# Altium footprint library CADTlink.PcbLib: 143 footprints (part 6 of 9)
Each footprint in its own frame and in the unit in brackets; x right, y up, seen from the top. Pads: shape width x height; smd on the part's side, far side on the other; paste and mask are expansions set on the pad; w line width, h text height; cw(c..) or ccw(c..) is an arc to the next point about the centre after c.
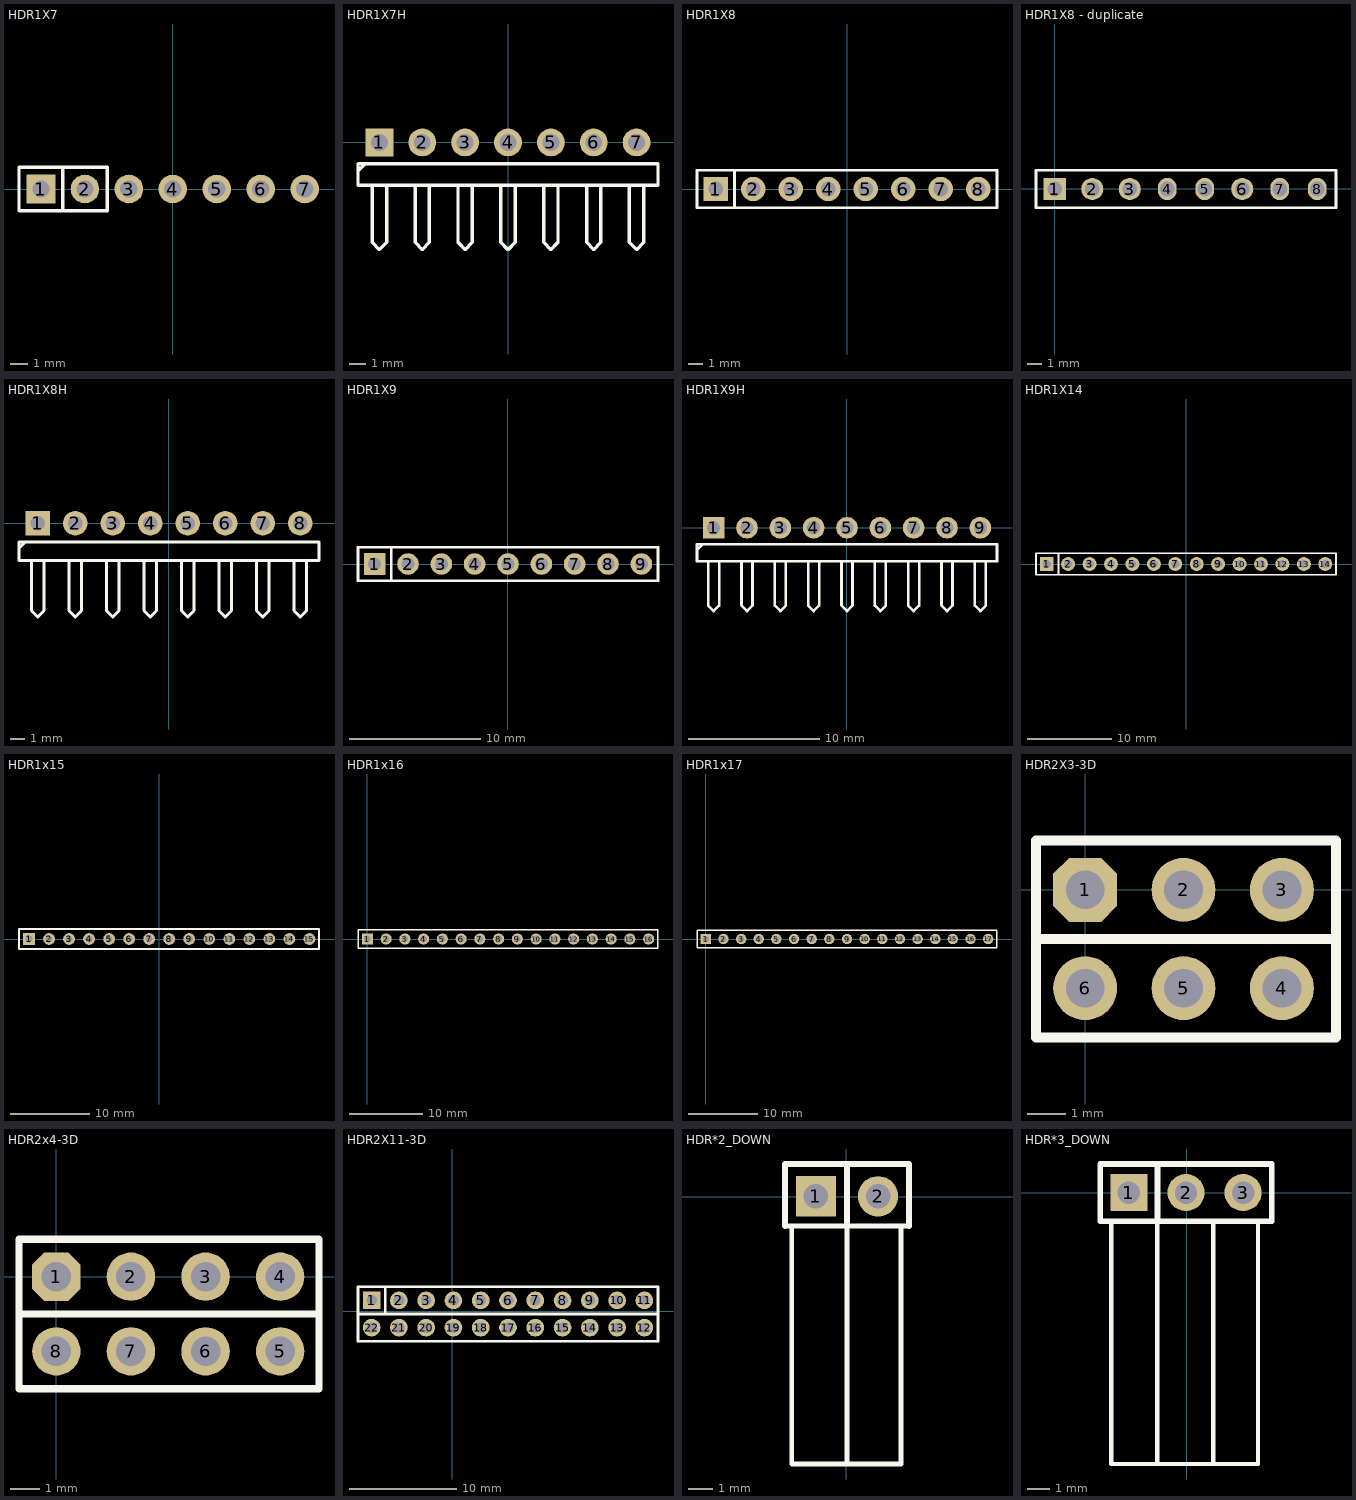
[diagram p5: the footprints below, top view; thin cyan lines are the x and y axes]

## HDR1X7 [mm]
pads (7):
  rect 1.65x1.65 hole 1: 1(-7.605,0)
  round 1.65 hole 1: 2(-5.065,0) 3(-2.525,0) 4(0.015,0) 5(2.555,0) 6(5.095,0) 7(7.635,0)
Top Overlay:
  lines w0.2: -6.335,-1.27 -6.335,1.27 ; -8.875,-1.27 -8.875,1.27 -3.785,1.27 -3.785,-1.27 -8.875,-1.27

## HDR1X7H [mm]
pads (7):
  rect 1.65x1.65 hole 1: 1(-7.62,0)
  round 1.65 hole 1: 2(-5.08,0) 3(-2.54,0) 4(0,0) 5(2.54,0) 6(5.08,0) 7(7.62,0)
Top Overlay:
  lines w0.2: -8.89,-1.693 -8.467,-1.27 ; -8.043,-2.54 -8.043,-5.927 -7.62,-6.35 -7.197,-5.927 -7.197,-2.54 ; -5.503,-2.54 -5.503,-5.927 -5.08,-6.35 -4.657,-5.927 -4.657,-2.54 ; -2.963,-2.54 -2.963,-5.927 -2.54,-6.35 -2.117,-5.927 -2.117,-2.54 ; -0.423,-2.54 -0.423,-5.927 0,-6.35 0.423,-5.927 0.423,-2.54 ; 2.117,-2.54 2.117,-5.927 2.54,-6.35 2.963,-5.927 2.963,-2.54 ; 4.657,-2.54 4.657,-5.927 5.08,-6.35 5.503,-5.927 5.503,-2.54 ; 7.197,-2.54 7.197,-5.927 7.62,-6.35 8.043,-5.927 8.043,-2.54 ; -8.89,-2.54 8.89,-2.54 8.89,-1.27 -8.89,-1.27 -8.89,-2.54

## HDR1X8 [mm]
pads (8):
  rect 1.65x1.65 hole 1: 1(-8.905,0)
  round 1.65 hole 1: 2(-6.365,0) 3(-3.825,0) 4(-1.285,0) 5(1.255,0) 6(3.795,0) 7(6.335,0) 8(8.875,0)
Top Overlay:
  lines w0.2: -7.635,-1.27 -7.635,1.27 ; -10.175,-1.27 10.145,-1.27 10.145,1.27 -10.175,1.27 -10.175,-1.27
3D body: height 0.7, standoff -10.9, extent -10.185,-1.321 10.135,1.219

## HDR1X8 - duplicate [mm] "Connector; Header; 8 Position"
pads (8):
  rect 1.5x1.5 hole 1: 1(0,0)
  round 1.5 hole 1: 2(2.54,0) 3(5.08,0) 6(12.7,0)
  oval 1.27x1.5 hole 1: 4(7.62,0) 5(10.16,0) 7(15.24,0) 8(17.78,0)
Top Overlay:
  lines w0.2: -1.27,-1.27 -1.27,1.27 19.05,1.27 19.05,-1.27 -1.27,-1.27
3D body: height 0.7, standoff -10.9, extent -1.27,-1.27 19.05,1.27

## HDR1X8H [mm]
pads (8):
  rect 1.65x1.65 hole 1: 1(-8.875,0)
  round 1.65 hole 1: 2(-6.335,0) 3(-3.795,0) 4(-1.255,0) 5(1.285,0) 6(3.825,0) 7(6.365,0) 8(8.905,0)
Top Overlay:
  lines w0.2: -10.145,-1.693 -9.722,-1.27 ; -9.298,-2.54 -9.298,-5.927 -8.875,-6.35 -8.452,-5.927 -8.452,-2.54 ; -6.758,-2.54 -6.758,-5.927 -6.335,-6.35 -5.912,-5.927 -5.912,-2.54 ; -4.218,-2.54 -4.218,-5.927 -3.795,-6.35 -3.372,-5.927 -3.372,-2.54 ; -1.678,-2.54 -1.678,-5.927 -1.255,-6.35 -0.832,-5.927 -0.832,-2.54 ; 0.862,-2.54 0.862,-5.927 1.285,-6.35 1.708,-5.927 1.708,-2.54 ; 3.402,-2.54 3.402,-5.927 3.825,-6.35 4.248,-5.927 4.248,-2.54 ; 5.942,-2.54 5.942,-5.927 6.365,-6.35 6.788,-5.927 6.788,-2.54 ; 8.482,-2.54 8.482,-5.927 8.905,-6.35 9.328,-5.927 9.328,-2.54 ; -10.145,-2.54 10.175,-2.54 10.175,-1.27 -10.145,-1.27 -10.145,-2.54

## HDR1X9 [mm]
pads (9):
  rect 1.65x1.65 hole 1: 1(-10.13,0)
  round 1.65 hole 1: 2(-7.59,0) 3(-5.05,0) 4(-2.51,0) 5(0.03,0) 6(2.57,0) 7(5.11,0) 8(7.65,0) 9(10.19,0)
Top Overlay:
  lines w0.2: -8.86,-1.27 -8.86,1.27 ; -11.4,-1.27 11.46,-1.27 11.46,1.27 -11.4,1.27 -11.4,-1.27

## HDR1X9H [mm]
pads (9):
  rect 1.65x1.65 hole 1: 1(-10.13,0)
  round 1.65 hole 1: 2(-7.59,0) 3(-5.05,0) 4(-2.51,0) 5(0.03,0) 6(2.57,0) 7(5.11,0) 8(7.65,0) 9(10.19,0)
Top Overlay:
  lines w0.2: -11.4,-1.693 -10.977,-1.27 ; -10.553,-2.54 -10.553,-5.927 -10.13,-6.35 -9.707,-5.927 -9.707,-2.54 ; -8.013,-2.54 -8.013,-5.927 -7.59,-6.35 -7.167,-5.927 -7.167,-2.54 ; -5.473,-2.54 -5.473,-5.927 -5.05,-6.35 -4.627,-5.927 -4.627,-2.54 ; -2.933,-2.54 -2.933,-5.927 -2.51,-6.35 -2.087,-5.927 -2.087,-2.54 ; -0.393,-2.54 -0.393,-5.927 0.03,-6.35 0.453,-5.927 0.453,-2.54 ; 2.147,-2.54 2.147,-5.927 2.57,-6.35 2.993,-5.927 2.993,-2.54 ; 4.687,-2.54 4.687,-5.927 5.11,-6.35 5.533,-5.927 5.533,-2.54 ; 7.227,-2.54 7.227,-5.927 7.65,-6.35 8.073,-5.927 8.073,-2.54 ; 9.767,-2.54 9.767,-5.927 10.19,-6.35 10.613,-5.927 10.613,-2.54 ; -11.4,-2.54 11.46,-2.54 11.46,-1.27 -11.4,-1.27 -11.4,-2.54

## HDR1X14 [mm]
pads (14):
  rect 1.65x1.65 hole 1: 1(-16.51,0)
  round 1.65 hole 1: 2(-13.97,0) 3(-11.43,0) 4(-8.89,0) 5(-6.35,0) 6(-3.81,0) 7(-1.27,0) 8(1.27,0) 9(3.81,0) 10(6.35,0) 11(8.89,0) 12(11.43,0) 13(13.97,0) 14(16.51,0)
Top Overlay:
  lines w0.2: -15.113,-1.27 -15.113,1.27 ; -17.78,-1.27 -17.78,1.27 17.78,1.27 17.78,-1.27 -17.78,-1.27

## HDR1x15 [mm]
pads (15):
  rect 1.5x1.5 hole 0.9: 1(-16.51,0)
  round 1.5 hole 0.9: 2(-13.97,0) 3(-11.43,0) 4(-8.89,0) 5(-6.35,0) 6(-3.81,0) 7(-1.27,0) 8(1.27,0) 9(3.81,0) 10(6.35,0) 11(8.89,0) 12(11.43,0) 13(13.97,0) 14(16.51,0) 15(19.05,0)
Top Overlay:
  lines w0.2: -17.78,-1.27 20.269,-1.27 20.269,1.27 -15.875,1.27 -17.78,1.27 -17.78,-1.27

## HDR1x16 [mm]
pads (16):
  rect 1.5x1.5 hole 0.9: 1(0,0)
  round 1.5 hole 0.9: 2(2.54,0) 3(5.08,0) 4(7.62,0) 5(10.16,0) 6(12.7,0) 7(15.24,0) 8(17.78,0) 9(20.32,0) 10(22.86,0) 11(25.4,0) 12(27.94,0) 13(30.48,0) 14(33.02,0) 15(35.56,0) 16(38.1,0)
Top Overlay:
  lines w0.2: -1.27,-1.27 -1.27,1.27 0.635,1.27 39.37,1.27 39.37,-1.27 -1.27,-1.27

## HDR1x17 [mm]
pads (17):
  rect 1.5x1.5 hole 0.9: 1(0,0)
  round 1.5 hole 0.9: 2(2.54,0) 3(5.08,0) 4(7.62,0) 5(10.16,0) 6(12.7,0) 7(15.24,0) 8(17.78,0) 9(20.32,0) 10(22.86,0) 11(25.4,0) 12(27.94,0) 13(30.48,0) 14(33.02,0) 15(35.56,0) 16(38.1,0) 17(40.64,0)
Top Overlay:
  lines w0.2: -1.27,-1.27 41.91,-1.27 41.91,1.27 0.635,1.27 -1.27,1.27 -1.27,-1.27
3D body: height 8.67, standoff -2.87, extent -1.137,-1.346 41.828,1.194

## HDR2X3-3D [mm]
pads (6):
  oct 1.65x1.65 hole 1: 1(0,0)
  round 1.65 hole 1: 2(2.54,0) 3(5.08,0) 4(5.08,-2.54) 5(2.54,-2.54) 6(0,-2.54)
Top Overlay:
  lines w0.254: -1.27,-1.27 6.477,-1.27 ; -1.27,-1.27 -1.27,1.27 6.477,1.27 6.477,-1.27 ; -1.27,-1.27 -1.27,-3.81 6.477,-3.81 6.477,-1.27 ; -1.27,-1.27 6.477,-1.27
3D body: height 8.54, standoff -3, extent -1.27,-1.27 1.27,1.27
3D body: height 8.54, standoff -3, extent 1.27,-1.27 3.81,1.27
3D body: height 8.54, standoff -3, extent 3.81,-1.27 6.35,1.27
3D body: height 8.54, standoff -3, extent 3.81,-3.81 6.35,-1.27
3D body: height 8.54, standoff -3, extent 1.27,-3.81 3.81,-1.27
3D body: height 8.54, standoff -3, extent -1.27,-3.81 1.27,-1.27

## HDR2x4-3D [mm]
pads (8):
  oct 1.65x1.65 hole 1: 1(0,0)
  round 1.65 hole 1: 2(2.54,0) 3(5.08,0) 4(7.62,0) 5(7.62,-2.54) 6(5.08,-2.54) 7(2.54,-2.54) 8(0,-2.54)
Top Overlay:
  lines w0.254: -1.27,-1.27 8.941,-1.27 ; -1.27,-1.27 -1.27,-3.81 8.941,-3.81 8.941,-1.27 ; -1.27,-1.27 -1.27,1.27 8.941,1.27 8.941,-1.27 ; -1.27,-1.27 8.941,-1.27
3D body: height 8.54, standoff -3, extent 6.35,-1.397 8.89,1.143
3D body: height 8.54, standoff -3, extent 6.35,-3.937 8.89,-1.397
3D body: height 8.54, standoff -3, extent -1.27,-3.81 1.27,-1.27
3D body: height 8.54, standoff -3, extent 1.27,-3.81 3.81,-1.27
3D body: height 8.54, standoff -3, extent 3.81,-3.81 6.35,-1.27
3D body: height 8.54, standoff -3, extent 3.81,-1.27 6.35,1.27
3D body: height 8.54, standoff -3, extent 1.27,-1.27 3.81,1.27
3D body: height 8.54, standoff -3, extent -1.27,-1.27 1.27,1.27

## HDR2X11-3D [mm]
pads (22):
  rect 1.65x1.65 hole 1: 1(-7.493,1.016)
  round 1.65 hole 1: 2(-4.953,1.016) 3(-2.413,1.016) 4(0.127,1.016) 5(2.667,1.016) 6(5.207,1.016) 7(7.747,1.016) 8(10.287,1.016) 9(12.827,1.016) 10(15.367,1.016) 11(17.907,1.016) 12(17.907,-1.524) 13(15.367,-1.524) 14(12.827,-1.524) 15(10.287,-1.524) 16(7.747,-1.524) 17(5.207,-1.524) 18(2.667,-1.524) 19(0.127,-1.524) 20(-2.413,-1.524) 21(-4.953,-1.524) 22(-7.493,-1.524)
Top Overlay:
  lines w0.254: -6.223,-0.254 -6.223,2.286 ; 19.177,-0.254 7.747,-0.254 ; -8.763,-0.254 7.747,-0.254 ; -8.763,-0.254 -8.763,-2.794 19.177,-2.794 19.177,2.286 -8.763,2.286 -8.763,-0.254 ; -8.763,-0.254 7.747,-0.254
3D body: height 8.54, standoff -3, extent 16.637,-2.794 19.177,-0.254
3D body: height 8.54, standoff -3, extent 16.637,-0.254 19.177,2.286
3D body: height 8.54, standoff -3, extent 14.097,-0.254 16.637,2.286
3D body: height 8.54, standoff -3, extent 14.097,-2.794 16.637,-0.254
3D body: height 8.54, standoff -3, extent 11.557,-2.794 14.097,-0.254
3D body: height 8.54, standoff -3, extent 9.017,-2.794 11.557,-0.254
3D body: height 8.54, standoff -3, extent 6.477,-2.794 9.017,-0.254
3D body: height 8.54, standoff -3, extent 3.937,-2.794 6.477,-0.254
3D body: height 8.54, standoff -3, extent 1.397,-2.794 3.937,-0.254
3D body: height 8.54, standoff -3, extent -1.143,-2.794 1.397,-0.254
3D body: height 8.54, standoff -3, extent -3.683,-2.794 -1.143,-0.254
3D body: height 8.54, standoff -3, extent -6.223,-2.794 -3.683,-0.254
3D body: height 8.54, standoff -3, extent -8.763,-2.794 -6.223,-0.254
3D body: height 8.54, standoff -3, extent -8.763,-0.254 -6.223,2.286
3D body: height 8.54, standoff -3, extent -6.223,-0.254 -3.683,2.286
3D body: height 8.54, standoff -3, extent -3.683,-0.254 -1.143,2.286
3D body: height 8.54, standoff -3, extent -1.143,-0.254 1.397,2.286
3D body: height 8.54, standoff -3, extent 1.397,-0.254 3.937,2.286
3D body: height 8.54, standoff -3, extent 3.937,-0.254 6.477,2.286
3D body: height 8.54, standoff -3, extent 6.477,-0.254 9.017,2.286
3D body: height 8.54, standoff -3, extent 9.017,-0.254 11.557,2.286
3D body: height 8.54, standoff -3, extent 11.557,-0.254 14.097,2.286

## HDR*2_DOWN [mm]
pads (2):
  rect 1.65x1.65 hole 1: 1(-1.245,0.025)
  round 1.65 hole 1: 2(1.295,0.025)
Top Overlay:
  lines w0.2: -2.515,-1.194 2.565,-1.194 ; -2.235,-1.219 -2.235,-10.922 2.235,-10.922 2.235,-1.219 ; 0.025,-10.922 0.025,-3.785 0.025,-1.194
  lines w0.254: -2.515,-1.194 -2.515,1.346 2.565,1.346 2.565,-1.194 ; 0.025,-1.194 0.025,1.346
3D body: height 2.57, standoff 0.03, extent -2.591,-10.292 2.489,1.247

## HDR*3_DOWN [mm]
pads (3):
  rect 1.65x1.65 hole 1: 1(-2.565,0)
  round 1.65 hole 1: 2(-0.025,0) 3(2.515,0)
Top Overlay:
  lines w0.2: -3.353,-1.27 -3.353,-12.065 3.175,-12.065 3.175,-1.321 ; -1.295,-12.065 -1.295,-1.27 ; 1.194,-12.04 1.194,-1.27
  lines w0.254: -1.295,-1.27 -1.295,1.27 ; -3.835,-1.27 -3.835,1.27 3.785,1.27 3.785,-1.27 -3.835,-1.27
3D body: height 1.27, standoff -1.27, extent -3.835,-11.435 3.785,0.105